# Altium footprint library ALL.PcbLib: 385 footprints (part 13 of 25)
Each footprint in its own frame and in the unit in brackets; x right, y up, seen from the top. Pads: shape width x height; smd on the part's side, far side on the other; paste and mask are expansions set on the pad; w line width, h text height; cw(c..) or ccw(c..) is an arc to the next point about the centre after c.
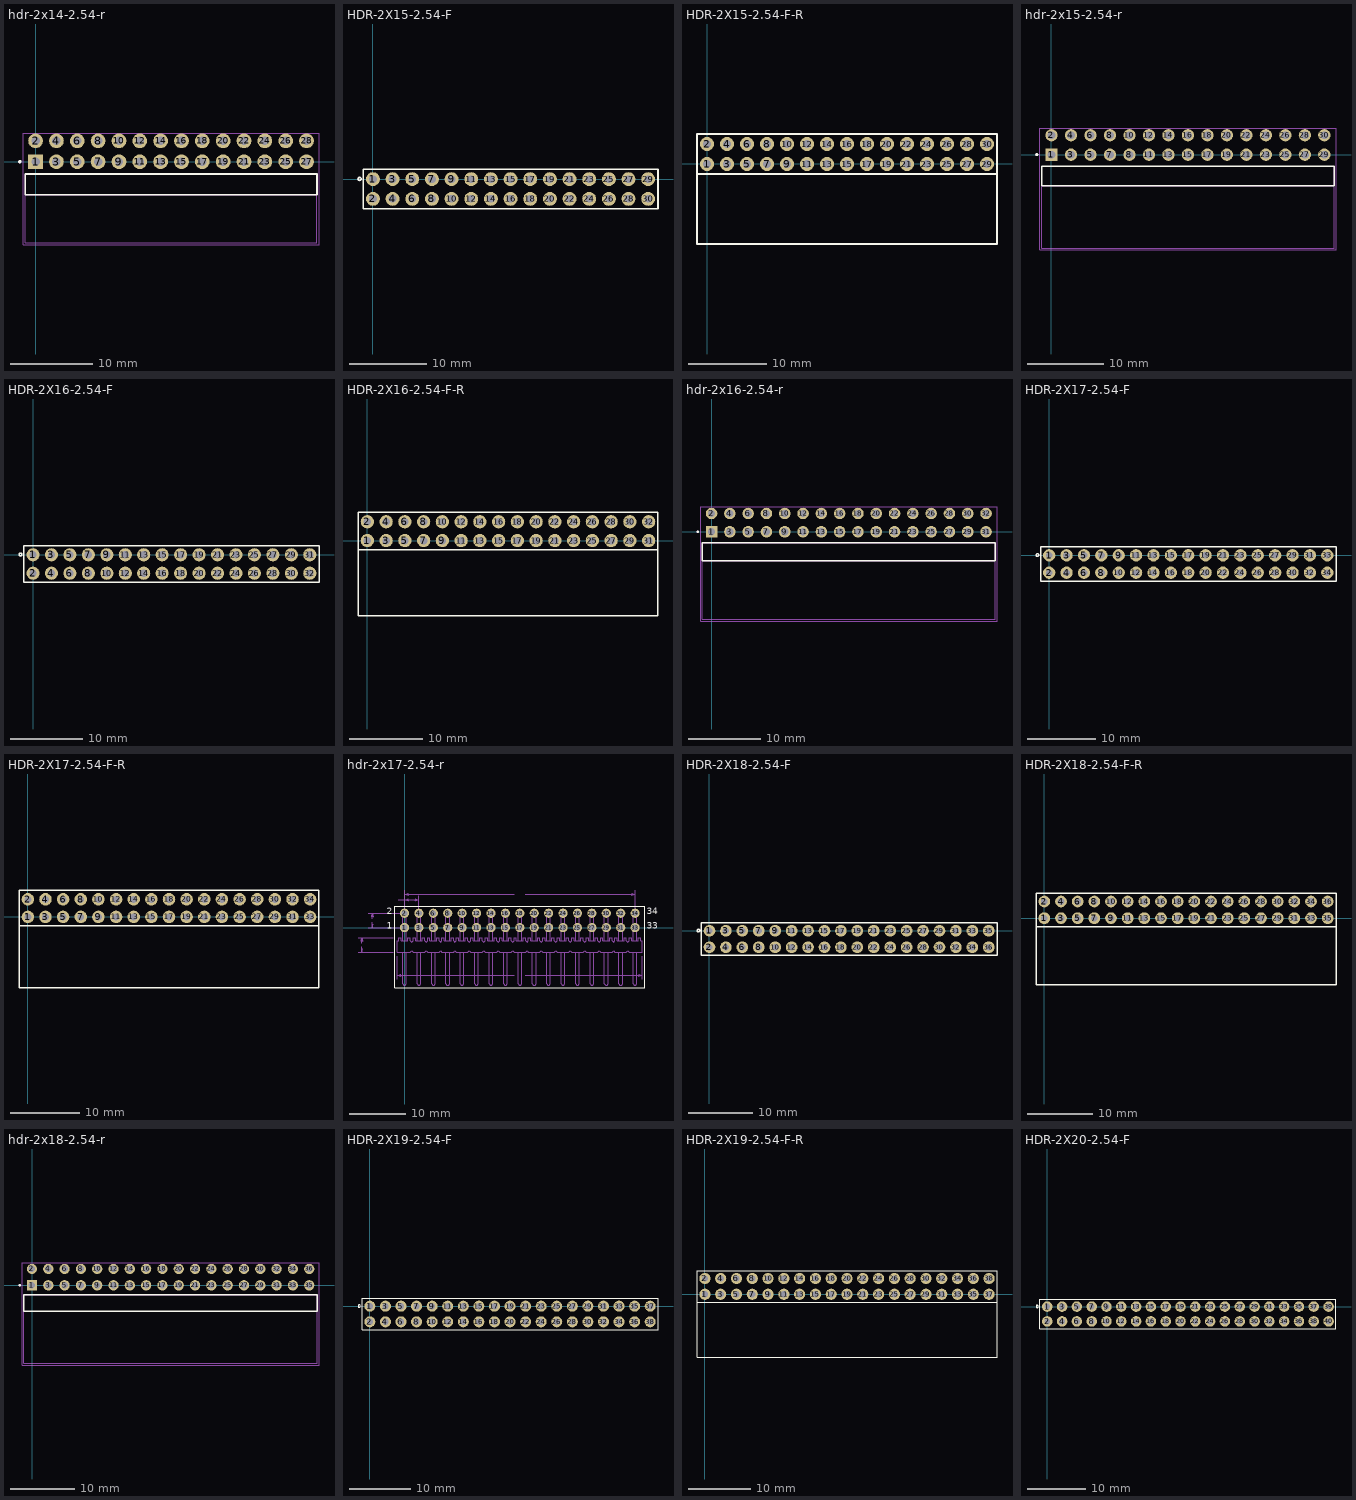
[diagram p12: the footprints below, top view; thin cyan lines are the x and y axes]

## hdr-2x14-2.54-r [mm]
pads (28):
  rect 1.8x1.8 hole 1.02: 1(0,0)
  round 1.8 hole 1.02: 2(0,2.54) 3(2.54,0) 4(2.54,2.54) 5(5.08,0) 6(5.08,2.54) 7(7.62,0) 8(7.62,2.54) 9(10.16,0) 10(10.16,2.54) 11(12.7,0) 12(12.7,2.54) 13(15.24,0) 14(15.24,2.54) 15(17.78,0) 16(17.78,2.54) 17(20.32,0) 18(20.32,2.54) 19(22.86,0) 20(22.86,2.54) 21(25.4,0) 22(25.4,2.54) 23(27.94,0) 24(27.94,2.54) 25(30.48,0) 26(30.48,2.54) 27(33.02,0) 28(33.02,2.54)
Top Overlay:
  circle w0.2: c-1.92,0 r0.1
  lines w0.2: -1.27,-4.04 34.29,-4.04 34.29,-1.5 -1.27,-1.5 -1.27,-4.04
Mechanical 13:
  circle w0.2: c-1.92,0 r0.1
  lines w0.1: -1.27,-4.04 -1.27,-9.88 34.29,-9.88 34.29,-4.04 ; -1.27,-4.04 34.29,-4.04 ; -1.27,-4.04 -1.27,-1.5 34.29,-1.5 34.29,-4.04
Mechanical 15:
  lines w0.05: -1.52,-10.13 34.54,-10.13 34.54,3.475 -1.52,3.475 -1.52,-10.13
3D body "TSW-114-08-S-D-RA.stp": height 5.54, standoff -2.31, extent -1.27,-9.811 34.29,2.953

## HDR-2X15-2.54-F [mm]
pads (30):
  round 1.8 hole 1: 1(0,0) 2(0,-2.54) 3(2.54,0) 4(2.54,-2.54) 5(5.08,0) 6(5.08,-2.54) 7(7.62,0) 8(7.62,-2.54) 9(10.16,0) 10(10.16,-2.54) 11(12.7,0) 12(12.7,-2.54) 13(15.24,0) 14(15.24,-2.54) 15(17.78,0) 16(17.78,-2.54) 17(20.32,0) 18(20.32,-2.54) 19(22.86,0) 20(22.86,-2.54) 21(25.4,0) 22(25.4,-2.54) 23(27.94,0) 24(27.94,-2.54) 25(30.48,0) 26(30.48,-2.54) 27(33.02,0) 28(33.02,-2.54) 29(35.56,0) 30(35.56,-2.54)
Top Overlay:
  circle w0.2: c-1.73,0.03 r0.2
  lines w0.2: -1.27,-3.81 36.83,-3.81 36.83,1.27 -1.27,1.27 -1.27,-3.81
3D body "PBD-2.stp": height 8.5, standoff -3.15, extent 31.75,-3.81 34.29,1.27
3D body "PBD-2.stp": height 8.5, standoff -3.15, extent 29.21,-3.81 31.75,1.27
3D body "PBD-2.stp": height 8.5, standoff -3.15, extent 34.29,-3.81 36.83,1.27
3D body "PBD-2.stp": height 8.5, standoff -3.15, extent 24.13,-3.81 26.67,1.27
3D body "PBD-2.stp": height 8.5, standoff -3.15, extent 21.59,-3.81 24.13,1.27
3D body "PBD-2.stp": height 8.5, standoff -3.15, extent 26.67,-3.81 29.21,1.27
3D body "PBD-2.stp": height 8.5, standoff -3.15, extent 16.51,-3.81 19.05,1.27
3D body "PBD-2.stp": height 8.5, standoff -3.15, extent 13.97,-3.81 16.51,1.27
3D body "PBD-2.stp": height 8.5, standoff -3.15, extent 19.05,-3.81 21.59,1.27
3D body "PBD-2.stp": height 8.5, standoff -3.15, extent 8.89,-3.81 11.43,1.27
3D body "PBD-2.stp": height 8.5, standoff -3.15, extent 6.35,-3.81 8.89,1.27
3D body "PBD-2.stp": height 8.5, standoff -3.15, extent 11.43,-3.81 13.97,1.27
3D body "PBD-2.stp": height 8.5, standoff -3.15, extent 1.27,-3.81 3.81,1.27
3D body "PBD-2.stp": height 8.5, standoff -3.15, extent -1.27,-3.81 1.27,1.27
3D body "PBD-2.stp": height 8.5, standoff -3.15, extent 3.81,-3.81 6.35,1.27

## HDR-2X15-2.54-F-R [mm]
pads (30):
  round 1.8 hole 1: 1(-0.025,-0.025) 2(-0.025,2.515) 3(2.515,-0.025) 4(2.515,2.515) 5(5.055,-0.025) 6(5.055,2.515) 7(7.595,-0.025) 8(7.595,2.515) 9(10.135,-0.025) 10(10.135,2.515) 11(12.675,-0.025) 12(12.675,2.515) 13(15.215,-0.025) 14(15.215,2.515) 15(17.755,-0.025) 16(17.755,2.515) 17(20.295,-0.025) 18(20.295,2.515) 19(22.835,-0.025) 20(22.835,2.515) 21(25.375,-0.025) 22(25.375,2.515) 23(27.915,-0.025) 24(27.915,2.515) 25(30.455,-0.025) 26(30.455,2.515) 27(32.995,-0.025) 28(32.995,2.515) 29(35.535,-0.025) 30(35.535,2.515)
Top Overlay:
  lines w0.2: -1.295,-1.295 -1.295,3.785 36.805,3.785 36.805,-1.295 ; -1.295,-1.295 36.805,-1.295 ; -1.295,-1.295 -1.295,-10.185 36.805,-10.185 36.805,-1.295
3D body "PBD-30R.step": height 5, standoff -3, extent -1.295,-10.185 36.805,2.815

## hdr-2x15-2.54-r [mm]
pads (30):
  rect 1.6x1.6 hole 1.02: 1(0,0)
  round 1.6 hole 1.02: 2(0,2.54) 3(2.54,0) 4(2.54,2.54) 5(5.08,0) 6(5.08,2.54) 7(7.62,0) 8(7.62,2.54) 8(10.16,0) 10(10.16,2.54) 11(12.7,0) 12(12.7,2.54) 13(15.24,0) 14(15.24,2.54) 15(17.78,0) 16(17.78,2.54) 17(20.32,0) 18(20.32,2.54) 19(22.86,0) 20(22.86,2.54) 21(25.4,0) 22(25.4,2.54) 23(27.94,0) 24(27.94,2.54) 25(30.48,0) 26(30.48,2.54) 27(33.02,0) 28(33.02,2.54) 29(35.56,0) 30(35.56,2.54)
Top Overlay:
  circle w0.2: c-1.92,0 r0.1
  lines w0.2: -1.27,-4.04 -1.27,-1.5 36.83,-1.5 36.83,-4.04 -1.27,-4.04
Mechanical 13:
  circle w0.2: c-1.92,0 r0.1
  lines w0.1: -1.27,-4.04 -1.27,-1.5 36.83,-1.5 36.83,-4.04 ; -1.27,-4.04 36.83,-4.04 ; -1.27,-4.04 -1.27,-12.17 36.83,-12.17 36.83,-4.04
Mechanical 15:
  lines w0.05: -1.52,-12.42 -1.52,3.475 37.08,3.475 37.08,-12.42 -1.52,-12.42
3D body "TSW-115-25-T-D-RA.stp": height 5.54, standoff -2.56, extent -1.168,-12.198 36.932,2.851

## HDR-2X16-2.54-F [mm]
pads (32):
  round 1.8 hole 1: 1(0,0) 2(0,-2.54) 3(2.54,0) 4(2.54,-2.54) 5(5.08,0) 6(5.08,-2.54) 7(7.62,0) 8(7.62,-2.54) 9(10.16,0) 10(10.16,-2.54) 11(12.7,0) 12(12.7,-2.54) 13(15.24,0) 14(15.24,-2.54) 15(17.78,0) 16(17.78,-2.54) 17(20.32,0) 18(20.32,-2.54) 19(22.86,0) 20(22.86,-2.54) 21(25.4,0) 22(25.4,-2.54) 23(27.94,0) 24(27.94,-2.54) 25(30.48,0) 26(30.48,-2.54) 27(33.02,0) 28(33.02,-2.54) 29(35.56,0) 30(35.56,-2.54) 31(38.1,0) 32(38.1,-2.54)
Top Overlay:
  circle w0.2: c-1.73,0.03 r0.2
  lines w0.2: -1.27,-3.81 -1.27,1.27 39.37,1.27 39.37,-3.81 -1.27,-3.81
3D body "PBD-2.stp": height 8.5, standoff -3.15, extent 36.83,-3.81 39.37,1.27
3D body "PBD-2.stp": height 8.5, standoff -3.15, extent 3.81,-3.81 6.35,1.27
3D body "PBD-2.stp": height 8.5, standoff -3.15, extent -1.27,-3.81 1.27,1.27
3D body "PBD-2.stp": height 8.5, standoff -3.15, extent 1.27,-3.81 3.81,1.27
3D body "PBD-2.stp": height 8.5, standoff -3.15, extent 11.43,-3.81 13.97,1.27
3D body "PBD-2.stp": height 8.5, standoff -3.15, extent 6.35,-3.81 8.89,1.27
3D body "PBD-2.stp": height 8.5, standoff -3.15, extent 8.89,-3.81 11.43,1.27
3D body "PBD-2.stp": height 8.5, standoff -3.15, extent 19.05,-3.81 21.59,1.27
3D body "PBD-2.stp": height 8.5, standoff -3.15, extent 13.97,-3.81 16.51,1.27
3D body "PBD-2.stp": height 8.5, standoff -3.15, extent 16.51,-3.81 19.05,1.27
3D body "PBD-2.stp": height 8.5, standoff -3.15, extent 26.67,-3.81 29.21,1.27
3D body "PBD-2.stp": height 8.5, standoff -3.15, extent 21.59,-3.81 24.13,1.27
3D body "PBD-2.stp": height 8.5, standoff -3.15, extent 24.13,-3.81 26.67,1.27
3D body "PBD-2.stp": height 8.5, standoff -3.15, extent 34.29,-3.81 36.83,1.27
3D body "PBD-2.stp": height 8.5, standoff -3.15, extent 29.21,-3.81 31.75,1.27
3D body "PBD-2.stp": height 8.5, standoff -3.15, extent 31.75,-3.81 34.29,1.27

## HDR-2X16-2.54-F-R [mm]
pads (32):
  round 1.8 hole 1: 1(0,0) 2(0,2.54) 3(2.54,0) 4(2.54,2.54) 5(5.08,0) 6(5.08,2.54) 7(7.62,0) 8(7.62,2.54) 9(10.16,0) 10(10.16,2.54) 11(12.7,0) 12(12.7,2.54) 13(15.24,0) 14(15.24,2.54) 15(17.78,0) 16(17.78,2.54) 17(20.32,0) 18(20.32,2.54) 19(22.86,0) 20(22.86,2.54) 21(25.4,0) 22(25.4,2.54) 23(27.94,0) 24(27.94,2.54) 25(30.48,0) 26(30.48,2.54) 27(33.02,0) 28(33.02,2.54) 29(35.56,0) 30(35.56,2.54) 31(38.1,0) 32(38.1,2.54)
Top Overlay:
  lines w0.2: -1.27,-1.27 -1.27,-10.16 39.37,-10.16 39.37,-1.27 ; -1.27,-1.27 39.37,-1.27 ; -1.27,-1.27 -1.27,3.81 39.37,3.81 39.37,-1.27
3D body "PBD-32R.step": height 5, standoff -3, extent -1.27,-10.16 39.37,2.84

## hdr-2x16-2.54-r [mm]
pads (32):
  rect 1.6x1.6 hole 1.02: 1(0,0)
  round 1.6 hole 1.02: 2(0,2.54) 3(2.54,0) 4(2.54,2.54) 5(5.08,0) 6(5.08,2.54) 7(7.62,0) 8(7.62,2.54) 9(10.16,0) 10(10.16,2.54) 11(12.7,0) 12(12.7,2.54) 13(15.24,0) 14(15.24,2.54) 15(17.78,0) 16(17.78,2.54) 17(20.32,0) 18(20.32,2.54) 19(22.86,0) 20(22.86,2.54) 21(25.4,0) 22(25.4,2.54) 23(27.94,0) 24(27.94,2.54) 25(30.48,0) 26(30.48,2.54) 27(33.02,0) 28(33.02,2.54) 29(35.56,0) 30(35.56,2.54) 31(38.1,0) 32(38.1,2.54)
Top Overlay:
  circle w0.2: c-1.92,0 r0.1
  lines w0.2: -1.27,-4.04 -1.27,-1.5 39.37,-1.5 39.37,-4.04 -1.27,-4.04
Mechanical 13:
  circle w0.2: c-1.92,0 r0.1
  lines w0.1: -1.27,-4.04 -1.27,-1.5 39.37,-1.5 39.37,-4.04 ; -1.27,-4.04 39.37,-4.04 ; -1.27,-4.04 -1.27,-12.17 39.37,-12.17 39.37,-4.04
Mechanical 15:
  lines w0.05: -1.52,-12.42 -1.52,3.475 39.62,3.475 39.62,-12.42 -1.52,-12.42
3D body "TSW-116-25-T-D-RA.stp": height 5.54, standoff -2.56, extent -1.321,-12.23 39.319,2.819

## HDR-2X17-2.54-F [mm]
pads (34):
  round 1.8 hole 1: 1(-0.025,0) 2(-0.025,-2.54) 3(2.515,0) 4(2.515,-2.54) 5(5.055,0) 6(5.055,-2.54) 7(7.595,0) 8(7.595,-2.54) 9(10.135,0) 10(10.135,-2.54) 11(12.675,0) 12(12.675,-2.54) 13(15.215,0) 14(15.215,-2.54) 15(17.755,0) 16(17.755,-2.54) 17(20.295,0) 18(20.295,-2.54) 19(22.835,0) 20(22.835,-2.54) 21(25.375,0) 22(25.375,-2.54) 23(27.915,0) 24(27.915,-2.54) 25(30.455,0) 26(30.455,-2.54) 27(32.995,0) 28(32.995,-2.54) 29(35.535,0) 30(35.535,-2.54) 31(38.075,0) 32(38.075,-2.54) 33(40.615,0) 34(40.615,-2.54)
Top Overlay:
  circle w0.2: c-1.755,0.03 r0.2
  lines w0.2: -1.295,-3.81 -1.295,1.27 41.885,1.27 41.885,-3.81 -1.295,-3.81
3D body "PBD-2.stp": height 8.5, standoff -3.15, extent 31.725,-3.81 34.265,1.27
3D body "PBD-2.stp": height 8.5, standoff -3.15, extent 29.185,-3.81 31.725,1.27
3D body "PBD-2.stp": height 8.5, standoff -3.15, extent 34.265,-3.81 36.805,1.27
3D body "PBD-2.stp": height 8.5, standoff -3.15, extent 24.105,-3.81 26.645,1.27
3D body "PBD-2.stp": height 8.5, standoff -3.15, extent 21.565,-3.81 24.105,1.27
3D body "PBD-2.stp": height 8.5, standoff -3.15, extent 26.645,-3.81 29.185,1.27
3D body "PBD-2.stp": height 8.5, standoff -3.15, extent 16.485,-3.81 19.025,1.27
3D body "PBD-2.stp": height 8.5, standoff -3.15, extent 13.945,-3.81 16.485,1.27
3D body "PBD-2.stp": height 8.5, standoff -3.15, extent 19.025,-3.81 21.565,1.27
3D body "PBD-2.stp": height 8.5, standoff -3.15, extent 8.865,-3.81 11.405,1.27
3D body "PBD-2.stp": height 8.5, standoff -3.15, extent 6.325,-3.81 8.865,1.27
3D body "PBD-2.stp": height 8.5, standoff -3.15, extent 11.405,-3.81 13.945,1.27
3D body "PBD-2.stp": height 8.5, standoff -3.15, extent 1.245,-3.81 3.785,1.27
3D body "PBD-2.stp": height 8.5, standoff -3.15, extent -1.295,-3.81 1.245,1.27
3D body "PBD-2.stp": height 8.5, standoff -3.15, extent 3.785,-3.81 6.325,1.27
3D body "PBD-2.stp": height 8.5, standoff -3.15, extent 36.805,-3.81 39.345,1.27
3D body "PBD-2.stp": height 8.5, standoff -3.15, extent 39.345,-3.81 41.885,1.27

## HDR-2X17-2.54-F-R [mm]
pads (34):
  round 1.8 hole 1: 1(0,0) 2(0,2.54) 3(2.54,0) 4(2.54,2.54) 5(5.08,0) 6(5.08,2.54) 7(7.62,0) 8(7.62,2.54) 9(10.16,0) 10(10.16,2.54) 11(12.7,0) 12(12.7,2.54) 13(15.24,0) 14(15.24,2.54) 15(17.78,0) 16(17.78,2.54) 17(20.32,0) 18(20.32,2.54) 19(22.86,0) 20(22.86,2.54) 21(25.4,0) 22(25.4,2.54) 23(27.94,0) 24(27.94,2.54) 25(30.48,0) 26(30.48,2.54) 27(33.02,0) 28(33.02,2.54) 29(35.56,0) 30(35.56,2.54) 31(38.1,0) 32(38.1,2.54) 33(40.64,0) 34(40.64,2.54)
Top Overlay:
  lines w0.2: -1.27,-1.27 -1.27,3.81 41.91,3.81 41.91,-1.27 ; -1.27,-1.27 41.91,-1.27 ; -1.27,-1.27 -1.27,-10.16 41.91,-10.16 41.91,-1.27
3D body "PBD-34R.step": height 5, standoff -3, extent -1.27,-10.16 41.91,2.84

## hdr-2x17-2.54-r [mm]
pads (34):
  round 1.62 hole 1.02: 1(0,0) 2(0,2.54) 3(2.54,0) 4(2.54,2.54) 5(5.08,0) 6(5.08,2.54) 7(7.62,0) 8(7.62,2.54) 9(10.16,0) 10(10.16,2.54) 11(12.7,0) 12(12.7,2.54) 13(15.24,0) 14(15.24,2.54) 15(17.78,0) 16(17.78,2.54) 17(20.32,0) 18(20.32,2.54) 19(22.86,0) 20(22.86,2.54) 21(25.4,0) 22(25.4,2.54) 23(27.94,0) 24(27.94,2.54) 25(30.48,0) 26(30.48,2.54) 27(33.02,0) 28(33.02,2.54) 29(35.56,0) 30(35.56,2.54) 31(38.1,0) 32(38.1,2.54) 33(40.64,0) 34(40.64,2.54)
Top Overlay:
  lines w0.2: -1.72,-10.61 42.36,-10.61 42.36,3.801 -1.72,3.801 -1.72,-10.61
  text "34" at 42.701,1.905 h1.97
  text "33" at 42.701,-0.635 h1.97
  text "2" at -3.09,1.905 h1.97
  text "1" at -3.09,-0.635 h1.97
Top Solder:
  circle w0: c40.64,2.54 r0.861
  circle w0: c40.64,0 r0.861
  circle w0: c38.1,2.54 r0.861
  circle w0: c38.1,0 r0.861
  circle w0: c35.56,2.54 r0.861
  circle w0: c35.56,0 r0.861
  circle w0: c33.02,2.54 r0.861
  circle w0: c33.02,0 r0.861
  circle w0: c30.48,2.54 r0.861
  circle w0: c30.48,0 r0.861
  circle w0: c27.94,2.54 r0.861
  circle w0: c27.94,0 r0.861
  circle w0: c25.4,2.54 r0.861
  circle w0: c25.4,0 r0.861
  circle w0: c22.86,2.54 r0.861
  circle w0: c22.86,0 r0.861
  circle w0: c20.32,2.54 r0.861
  circle w0: c20.32,0 r0.861
  circle w0: c17.78,2.54 r0.861
  circle w0: c17.78,0 r0.861
  circle w0: c15.24,2.54 r0.861
  circle w0: c15.24,0 r0.861
  circle w0: c12.7,2.54 r0.861
  circle w0: c12.7,0 r0.861
  circle w0: c10.16,2.54 r0.861
  circle w0: c10.16,0 r0.861
  circle w0: c7.62,2.54 r0.861
  circle w0: c7.62,0 r0.861
  circle w0: c5.08,2.54 r0.861
  circle w0: c5.08,0 r0.861
  circle w0: c2.54,2.54 r0.861
  circle w0: c2.54,0 r0.861
  circle w0: c0,2.54 r0.861
  circle w0: c0,0 r0.861
Bottom Solder:
  circle w0: c40.64,2.54 r0.861
  circle w0: c40.64,0 r0.861
  circle w0: c38.1,2.54 r0.861
  circle w0: c38.1,0 r0.861
  circle w0: c35.56,2.54 r0.861
  circle w0: c35.56,0 r0.861
  circle w0: c33.02,2.54 r0.861
  circle w0: c33.02,0 r0.861
  circle w0: c30.48,2.54 r0.861
  circle w0: c30.48,0 r0.861
  circle w0: c27.94,2.54 r0.861
  circle w0: c27.94,0 r0.861
  circle w0: c25.4,2.54 r0.861
  circle w0: c25.4,0 r0.861
  circle w0: c22.86,2.54 r0.861
  circle w0: c22.86,0 r0.861
  circle w0: c20.32,2.54 r0.861
  circle w0: c20.32,0 r0.861
  circle w0: c17.78,2.54 r0.861
  circle w0: c17.78,0 r0.861
  circle w0: c15.24,2.54 r0.861
  circle w0: c15.24,0 r0.861
  circle w0: c12.7,2.54 r0.861
  circle w0: c12.7,0 r0.861
  circle w0: c10.16,2.54 r0.861
  circle w0: c10.16,0 r0.861
  circle w0: c7.62,2.54 r0.861
  circle w0: c7.62,0 r0.861
  circle w0: c5.08,2.54 r0.861
  circle w0: c5.08,0 r0.861
  circle w0: c2.54,2.54 r0.861
  circle w0: c2.54,0 r0.861
  circle w0: c0,2.54 r0.861
  circle w0: c0,0 r0.861
Mechanical 16:
  drawing of 342 lines, arcs and shapes, not listed
  text "34" at 42.701,1.905 h1.97
  text "33" at 42.701,-0.635 h1.97
  text "2" at -3.09,1.905 h1.97
  text "1" at -3.09,-0.635 h1.97
Mechanical 40:
  lines w0: -8.194,-4.318 -1.971,-4.318 ; -8.194,-1.778 -1.971,-1.778 ; -7.493,-3.366 -7.493,-4.318 ; -7.493,-2.73 -7.493,-1.778 ; -6.353,0 -0.701,0 ; -6.353,2.54 -0.701,2.54 ; -5.652,0.952 -5.652,0 ; -5.652,1.588 -5.652,2.54 ; -1.27,-9.083 -1.27,-5.019 ; -1.118,4.89 0,4.89 ; 0,5.591 0,3.241 0,6.607 ; 2.54,3.241 2.54,5.591 ; 19.329,-8.382 -1.27,-8.382 ; 19.329,5.906 0,5.906 ; 21.311,-8.382 41.91,-8.382 ; 21.311,5.906 40.64,5.906 ; 40.64,3.241 40.64,6.607 ; 41.91,-9.083 41.91,-5.019 ; -7.652,-3.683 -7.572,-3.746 -7.493,-4.318 ; -7.652,-3.683 -7.493,-3.81 ; -7.652,-3.683 -7.493,-4.318 ; -7.493,-4.318 -7.493,-3.81 ; -7.493,-4.318 -7.414,-3.746 -7.493,-3.81 ; -7.493,-4.318 -7.334,-3.683 -7.493,-3.81 ; -7.493,-2.286 -7.493,-1.778 ; -7.493,-2.286 -7.572,-2.35 -7.493,-1.778 ; -7.493,-2.286 -7.334,-2.413 ; -7.493,-2.286 -7.652,-2.413 -7.493,-1.778 ; -7.493,-1.778 -7.414,-2.35 -7.334,-2.413 ; -7.493,-1.778 -7.334,-2.413 ; -5.81,0.635 -5.731,0.572 -5.652,0 ; -5.81,0.635 -5.652,0.508 ; -5.81,0.635 -5.652,0 ; -5.652,0 -5.652,0.508 ; -5.652,0 -5.572,0.572 -5.652,0.508 ; -5.652,0 -5.493,0.635 -5.652,0.508 ; -5.652,2.032 -5.652,2.54 ; -5.652,2.032 -5.731,1.968 -5.652,2.54 ; -5.652,2.032 -5.493,1.905 ; -5.652,2.032 -5.81,1.905 -5.652,2.54 ; -5.652,2.54 -5.572,1.968 -5.493,1.905 ; -5.652,2.54 -5.493,1.905 ; -1.27,-8.382 -0.698,-8.303 -0.635,-8.223 ; -1.27,-8.382 -0.762,-8.382 ; -1.27,-8.382 -0.698,-8.461 -0.762,-8.382 ; -1.27,-8.382 -0.635,-8.541 -0.762,-8.382 ; -1.27,-8.382 -0.635,-8.223 ; -0.762,-8.382 -0.635,-8.223 ; 0,4.89 2.54,4.89 ; 0,4.89 0.572,4.969 0.635,5.048 ; 0,4.89 0.508,4.89 ; 0,4.89 0.572,4.81 0.508,4.89 ; 0,4.89 0.635,4.731 0.508,4.89 ; 0,4.89 0.635,5.048 ; 0,5.906 0.572,5.985 0.635,6.064 ; 0,5.906 0.508,5.906 ; 0,5.906 0.572,5.826 0.508,5.906 ; 0,5.906 0.635,5.747 0.508,5.906 ; 0,5.906 0.635,6.064 ; 0.508,4.89 0.635,5.048 ; 0.508,5.906 0.635,6.064 ; 1.905,4.731 1.968,4.81 2.54,4.89 ; 1.905,4.731 2.032,4.89 ; 1.905,4.731 2.54,4.89 ; 2.032,4.89 2.54,4.89 ; 2.032,4.89 1.968,4.969 2.54,4.89 ; 2.032,4.89 1.905,5.048 2.54,4.89 ; 40.005,5.747 40.068,5.826 40.64,5.906 ; 40.005,5.747 40.132,5.906 ; 40.005,5.747 40.64,5.906 ; 40.132,5.906 40.64,5.906 ; 40.132,5.906 40.068,5.985 40.64,5.906 ; 40.132,5.906 40.005,6.064 40.64,5.906 ; 41.275,-8.541 41.338,-8.461 41.91,-8.382 ; 41.275,-8.541 41.402,-8.382 ; 41.275,-8.541 41.91,-8.382 ; 41.402,-8.382 41.91,-8.382 ; 41.402,-8.382 41.338,-8.303 41.91,-8.382 ; 41.402,-8.382 41.275,-8.223 41.91,-8.382
  text "40.640" at 19.52,5.778 h0.39
  text "43.180" at 19.52,-8.509 h0.39
  text "2.540" at -2.629,4.762 h0.39
  text "2.540" at -6.312,1.143 h0.39
  text "2.540" at -8.153,-3.175 h0.39
3D body "TSW-117-25-T-D-RA.stp": height 5.54, standoff -2.56, extent -1.219,-12.173 41.961,2.877

## HDR-2X18-2.54-F [mm]
pads (36):
  round 1.8 hole 1: 1(0,0.025) 2(0,-2.515) 3(2.54,0.025) 4(2.54,-2.515) 5(5.08,0.025) 6(5.08,-2.515) 7(7.62,0.025) 8(7.62,-2.515) 9(10.16,0.025) 10(10.16,-2.515) 11(12.7,0.025) 12(12.7,-2.515) 13(15.24,0.025) 14(15.24,-2.515) 15(17.78,0.025) 16(17.78,-2.515) 17(20.32,0.025) 18(20.32,-2.515) 19(22.86,0.025) 20(22.86,-2.515) 21(25.4,0.025) 22(25.4,-2.515) 23(27.94,0.025) 24(27.94,-2.515) 25(30.48,0.025) 26(30.48,-2.515) 27(33.02,0.025) 28(33.02,-2.515) 29(35.56,0.025) 30(35.56,-2.515) 31(38.1,0.025) 32(38.1,-2.515) 33(40.64,0.025) 34(40.64,-2.515) 35(43.18,0.025) 36(43.18,-2.515)
Top Overlay:
  circle w0.2: c-1.73,0.055 r0.2
  lines w0.2: -1.27,-3.785 -1.27,1.295 44.45,1.295 44.45,-3.785 -1.27,-3.785
3D body "PBD-2.stp": height 8.5, standoff -3.15, extent 39.37,-3.785 41.91,1.295
3D body "PBD-2.stp": height 8.5, standoff -3.15, extent 36.83,-3.785 39.37,1.295
3D body "PBD-2.stp": height 8.5, standoff -3.15, extent 41.91,-3.785 44.45,1.295
3D body "PBD-2.stp": height 8.5, standoff -3.15, extent 31.75,-3.785 34.29,1.295
3D body "PBD-2.stp": height 8.5, standoff -3.15, extent 29.21,-3.785 31.75,1.295
3D body "PBD-2.stp": height 8.5, standoff -3.15, extent 34.29,-3.785 36.83,1.295
3D body "PBD-2.stp": height 8.5, standoff -3.15, extent 24.13,-3.785 26.67,1.295
3D body "PBD-2.stp": height 8.5, standoff -3.15, extent 21.59,-3.785 24.13,1.295
3D body "PBD-2.stp": height 8.5, standoff -3.15, extent 26.67,-3.785 29.21,1.295
3D body "PBD-2.stp": height 8.5, standoff -3.15, extent 16.51,-3.785 19.05,1.295
3D body "PBD-2.stp": height 8.5, standoff -3.15, extent 13.97,-3.785 16.51,1.295
3D body "PBD-2.stp": height 8.5, standoff -3.15, extent 19.05,-3.785 21.59,1.295
3D body "PBD-2.stp": height 8.5, standoff -3.15, extent 8.89,-3.785 11.43,1.295
3D body "PBD-2.stp": height 8.5, standoff -3.15, extent 6.35,-3.785 8.89,1.295
3D body "PBD-2.stp": height 8.5, standoff -3.15, extent 11.43,-3.785 13.97,1.295
3D body "PBD-2.stp": height 8.5, standoff -3.15, extent 1.27,-3.785 3.81,1.295
3D body "PBD-2.stp": height 8.5, standoff -3.15, extent -1.27,-3.785 1.27,1.295
3D body "PBD-2.stp": height 8.5, standoff -3.15, extent 3.81,-3.785 6.35,1.295

## HDR-2X18-2.54-F-R [mm]
pads (36):
  round 1.8 hole 1: 1(0,-0.025) 2(0,2.515) 3(2.54,-0.025) 4(2.54,2.515) 5(5.08,-0.025) 6(5.08,2.515) 7(7.62,-0.025) 8(7.62,2.515) 9(10.16,-0.025) 10(10.16,2.515) 11(12.7,-0.025) 12(12.7,2.515) 13(15.24,-0.025) 14(15.24,2.515) 15(17.78,-0.025) 16(17.78,2.515) 17(20.32,-0.025) 18(20.32,2.515) 19(22.86,-0.025) 20(22.86,2.515) 21(25.4,-0.025) 22(25.4,2.515) 23(27.94,-0.025) 24(27.94,2.515) 25(30.48,-0.025) 26(30.48,2.515) 27(33.02,-0.025) 28(33.02,2.515) 29(35.56,-0.025) 30(35.56,2.515) 31(38.1,-0.025) 32(38.1,2.515) 33(40.64,-0.025) 34(40.64,2.515) 35(43.18,-0.025) 36(43.18,2.515)
Top Overlay:
  lines w0.2: -1.27,-1.295 -1.27,-10.185 44.45,-10.185 44.45,-1.295 ; -1.27,-1.295 44.45,-1.295 ; -1.27,-1.295 -1.27,3.785 44.45,3.785 44.45,-1.295
3D body "PBD-36R.step": height 5, standoff -3, extent -1.27,-10.185 44.45,2.815

## hdr-2x18-2.54-r [mm]
pads (36):
  rect 1.6x1.6 hole 1.02: 1(-0.025,0)
  round 1.6 hole 1.02: 2(-0.025,2.54) 3(2.515,0) 4(2.515,2.54) 5(5.055,0) 6(5.055,2.54) 7(7.595,0) 8(7.595,2.54) 9(10.135,0) 10(10.135,2.54) 11(12.675,0) 12(12.675,2.54) 13(15.215,0) 14(15.215,2.54) 15(17.755,0) 16(17.755,2.54) 17(20.295,0) 18(20.295,2.54) 19(22.835,0) 20(22.835,2.54) 21(25.375,0) 22(25.375,2.54) 23(27.915,0) 24(27.915,2.54) 25(30.455,0) 26(30.455,2.54) 27(32.995,0) 28(32.995,2.54) 29(35.535,0) 30(35.535,2.54) 31(38.075,0) 32(38.075,2.54) 33(40.615,0) 34(40.615,2.54) 35(43.155,0) 36(43.155,2.54)
Top Overlay:
  circle w0.2: c-1.945,0 r0.1
  lines w0.2: -1.295,-4.04 44.425,-4.04 44.425,-1.5 -1.295,-1.5 -1.295,-4.04
Mechanical 13:
  circle w0.2: c-1.945,0 r0.1
  lines w0.1: -1.295,-4.04 -1.295,-12.17 44.425,-12.17 44.425,-4.04 ; -1.295,-4.04 44.425,-4.04 ; -1.295,-4.04 -1.295,-1.5 44.425,-1.5 44.425,-4.04
Mechanical 15:
  lines w0.05: -1.545,-12.42 44.675,-12.42 44.675,3.475 -1.545,3.475 -1.545,-12.42
3D body "TSW-118-25-T-D-RA.stp": height 5.54, standoff -2.56, extent -1.321,-12.071 44.399,2.978

## HDR-2X19-2.54-F [mm]
pads (38):
  round 1.8 hole 1: 1(0,0) 2(0,-2.54) 3(2.54,0) 4(2.54,-2.54) 5(5.08,0) 6(5.08,-2.54) 7(7.62,0) 8(7.62,-2.54) 9(10.16,0) 10(10.16,-2.54) 11(12.7,0) 12(12.7,-2.54) 13(15.24,0) 14(15.24,-2.54) 15(17.78,0) 16(17.78,-2.54) 17(20.32,0) 18(20.32,-2.54) 19(22.86,0) 20(22.86,-2.54) 21(25.4,0) 22(25.4,-2.54) 23(27.94,0) 24(27.94,-2.54) 25(30.48,0) 26(30.48,-2.54) 27(33.02,0) 28(33.02,-2.54) 29(35.56,0) 30(35.56,-2.54) 31(38.1,0) 32(38.1,-2.54) 33(40.64,0) 34(40.64,-2.54) 35(43.18,0) 36(43.18,-2.54) 37(45.72,0) 38(45.72,-2.54)
Top Overlay:
  circle w0.2: c-1.73,0.03 r0.2
  lines w0.2: -1.27,-3.81 -1.27,1.27 46.99,1.27 46.99,-3.81 -1.27,-3.81
3D body "PBD-2.stp": height 8.5, standoff -3.15, extent 44.45,-3.81 46.99,1.27
3D body "PBD-2.stp": height 8.5, standoff -3.15, extent 3.81,-3.81 6.35,1.27
3D body "PBD-2.stp": height 8.5, standoff -3.15, extent -1.27,-3.81 1.27,1.27
3D body "PBD-2.stp": height 8.5, standoff -3.15, extent 1.27,-3.81 3.81,1.27
3D body "PBD-2.stp": height 8.5, standoff -3.15, extent 11.43,-3.81 13.97,1.27
3D body "PBD-2.stp": height 8.5, standoff -3.15, extent 6.35,-3.81 8.89,1.27
3D body "PBD-2.stp": height 8.5, standoff -3.15, extent 8.89,-3.81 11.43,1.27
3D body "PBD-2.stp": height 8.5, standoff -3.15, extent 19.05,-3.81 21.59,1.27
3D body "PBD-2.stp": height 8.5, standoff -3.15, extent 13.97,-3.81 16.51,1.27
3D body "PBD-2.stp": height 8.5, standoff -3.15, extent 16.51,-3.81 19.05,1.27
3D body "PBD-2.stp": height 8.5, standoff -3.15, extent 26.67,-3.81 29.21,1.27
3D body "PBD-2.stp": height 8.5, standoff -3.15, extent 21.59,-3.81 24.13,1.27
3D body "PBD-2.stp": height 8.5, standoff -3.15, extent 24.13,-3.81 26.67,1.27
3D body "PBD-2.stp": height 8.5, standoff -3.15, extent 34.29,-3.81 36.83,1.27
3D body "PBD-2.stp": height 8.5, standoff -3.15, extent 29.21,-3.81 31.75,1.27
3D body "PBD-2.stp": height 8.5, standoff -3.15, extent 31.75,-3.81 34.29,1.27
3D body "PBD-2.stp": height 8.5, standoff -3.15, extent 41.91,-3.81 44.45,1.27
3D body "PBD-2.stp": height 8.5, standoff -3.15, extent 36.83,-3.81 39.37,1.27
3D body "PBD-2.stp": height 8.5, standoff -3.15, extent 39.37,-3.81 41.91,1.27

## HDR-2X19-2.54-F-R [mm]
pads (38):
  round 1.8 hole 1: 1(0,0) 2(0,2.54) 3(2.54,0) 4(2.54,2.54) 5(5.08,0) 6(5.08,2.54) 7(7.62,0) 8(7.62,2.54) 9(10.16,0) 10(10.16,2.54) 11(12.7,0) 12(12.7,2.54) 13(15.24,0) 14(15.24,2.54) 15(17.78,0) 16(17.78,2.54) 17(20.32,0) 18(20.32,2.54) 19(22.86,0) 20(22.86,2.54) 21(25.4,0) 22(25.4,2.54) 23(27.94,0) 24(27.94,2.54) 25(30.48,0) 26(30.48,2.54) 27(33.02,0) 28(33.02,2.54) 29(35.56,0) 30(35.56,2.54) 31(38.1,0) 32(38.1,2.54) 33(40.64,0) 34(40.64,2.54) 35(43.18,0) 36(43.18,2.54) 37(45.72,0) 38(45.72,2.54)
Top Overlay:
  lines w0.2: -1.27,-1.27 -1.27,3.81 46.99,3.81 46.99,-1.27 ; -1.27,-1.27 46.99,-1.27 ; -1.27,-1.27 -1.27,-10.16 46.99,-10.16 46.99,-1.27
3D body "PBD-38R.step": height 5, standoff -3, extent -1.27,-10.16 46.99,2.84

## HDR-2X20-2.54-F [mm]
pads (40):
  round 1.8 hole 1: 1(0,0) 2(0,-2.54) 3(2.54,0) 4(2.54,-2.54) 5(5.08,0) 6(5.08,-2.54) 7(7.62,0) 8(7.62,-2.54) 9(10.16,0) 10(10.16,-2.54) 11(12.7,0) 12(12.7,-2.54) 13(15.24,0) 14(15.24,-2.54) 15(17.78,0) 16(17.78,-2.54) 17(20.32,0) 18(20.32,-2.54) 19(22.86,0) 20(22.86,-2.54) 21(25.4,0) 22(25.4,-2.54) 23(27.94,0) 24(27.94,-2.54) 25(30.48,0) 26(30.48,-2.54) 27(33.02,0) 28(33.02,-2.54) 29(35.56,0) 30(35.56,-2.54) 31(38.1,0) 32(38.1,-2.54) 33(40.64,0) 34(40.64,-2.54) 35(43.18,0) 36(43.18,-2.54) 37(45.72,0) 38(45.72,-2.54) 39(48.26,0) 40(48.26,-2.54)
Top Overlay:
  circle w0.2: c-1.73,0.03 r0.2
  lines w0.2: -1.27,-3.81 49.53,-3.81 49.53,1.27 -1.27,1.27 -1.27,-3.81
3D body "PBD-2.stp": height 8.5, standoff -3.15, extent 3.81,-3.81 6.35,1.27
3D body "PBD-2.stp": height 8.5, standoff -3.15, extent -1.27,-3.81 1.27,1.27
3D body "PBD-2.stp": height 8.5, standoff -3.15, extent 1.27,-3.81 3.81,1.27
3D body "PBD-2.stp": height 8.5, standoff -3.15, extent 11.43,-3.81 13.97,1.27
3D body "PBD-2.stp": height 8.5, standoff -3.15, extent 6.35,-3.81 8.89,1.27
3D body "PBD-2.stp": height 8.5, standoff -3.15, extent 8.89,-3.81 11.43,1.27
3D body "PBD-2.stp": height 8.5, standoff -3.15, extent 19.05,-3.81 21.59,1.27
3D body "PBD-2.stp": height 8.5, standoff -3.15, extent 13.97,-3.81 16.51,1.27
3D body "PBD-2.stp": height 8.5, standoff -3.15, extent 16.51,-3.81 19.05,1.27
3D body "PBD-2.stp": height 8.5, standoff -3.15, extent 26.67,-3.81 29.21,1.27
3D body "PBD-2.stp": height 8.5, standoff -3.15, extent 21.59,-3.81 24.13,1.27
3D body "PBD-2.stp": height 8.5, standoff -3.15, extent 24.13,-3.81 26.67,1.27
3D body "PBD-2.stp": height 8.5, standoff -3.15, extent 34.29,-3.81 36.83,1.27
3D body "PBD-2.stp": height 8.5, standoff -3.15, extent 29.21,-3.81 31.75,1.27
3D body "PBD-2.stp": height 8.5, standoff -3.15, extent 31.75,-3.81 34.29,1.27
3D body "PBD-2.stp": height 8.5, standoff -3.15, extent 41.91,-3.81 44.45,1.27
3D body "PBD-2.stp": height 8.5, standoff -3.15, extent 36.83,-3.81 39.37,1.27
3D body "PBD-2.stp": height 8.5, standoff -3.15, extent 39.37,-3.81 41.91,1.27
3D body "PBD-2.stp": height 8.5, standoff -3.15, extent 44.45,-3.81 46.99,1.27
3D body "PBD-2.stp": height 8.5, standoff -3.15, extent 46.99,-3.81 49.53,1.27